# Altium footprint library Cty1.PcbLib: 869 footprints (part 15 of 55)
Each footprint in its own frame and in the unit in brackets; x right, y up, seen from the top. Pads: shape width x height; smd on the part's side, far side on the other; paste and mask are expansions set on the pad; w line width, h text height; cw(c..) or ccw(c..) is an arc to the next point about the centre after c.
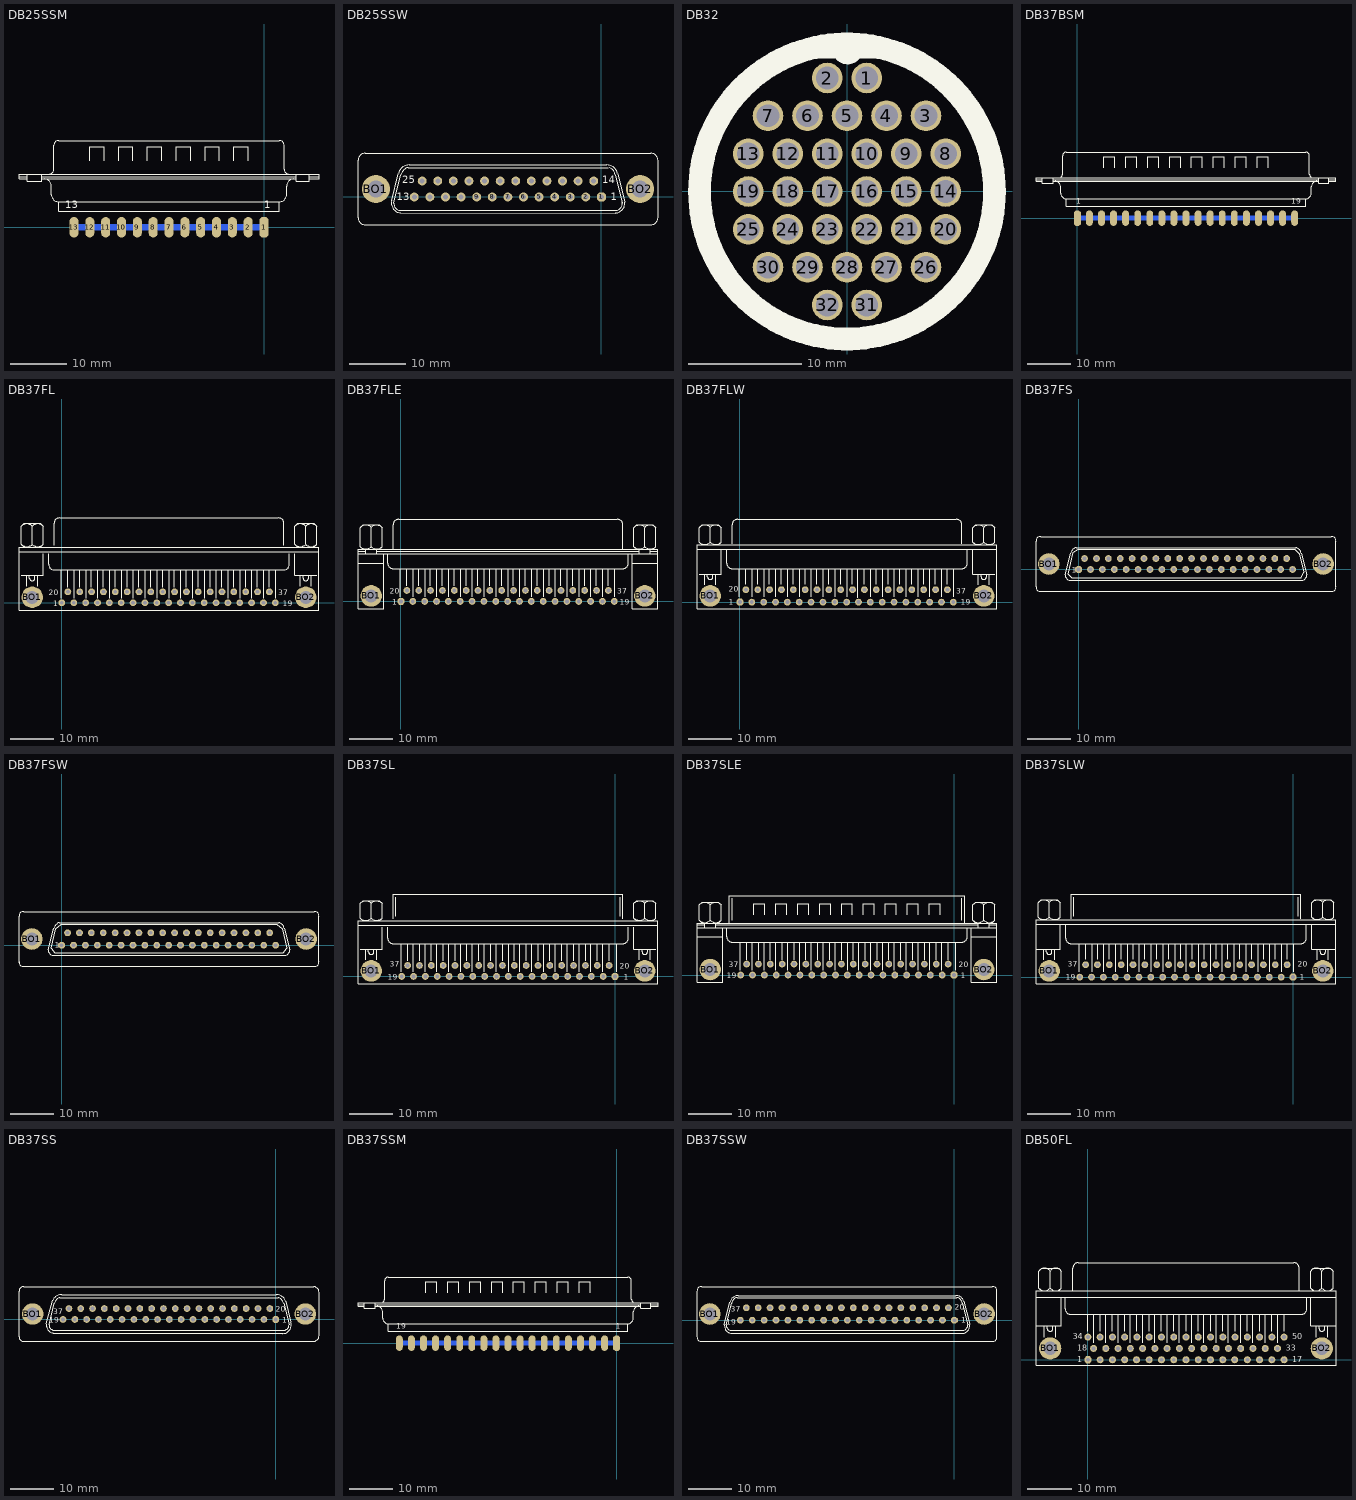
[diagram p14: the footprints below, top view; thin cyan lines are the x and y axes]

## DB25SSM [mil]
pads (25):
  oct 62.5x141.67 smd: 1(0,0)
  oval 62.5x141.67 smd: 2(-110,0) 3(-220,0) 4(-330,0) 5(-440,0) 6(-550,0) 7(-660,0) 8(-770,0) 9(-880,0) 10(-990,0) 11(-1100,0) 12(-1210,0) 13(-1320,0)
  oval 78.74x39.37 smd far side: 14(-55,0) 15(-165,0) 16(-275,0) 17(-385,0) 18(-495,0) 19(-605,0) 20(-715,0) 21(-825,0) 22(-935,0) 23(-1045,0) 24(-1155,0) 25(-1265,0)
Top Overlay:
  lines w8: -1701.67,351.67 -1643.33,351.67 ; -1643.33,335 -1701.67,335 -1701.67,368.33 381.67,368.33 381.67,335 315,335 ; -1643.33,368.33 -1643.33,318.33 -1543.33,318.33 -1543.33,368.33 ; -1543.33,335 223.33,335 ; -1543.33,351.67 223.33,351.67 ; -1526.67,335 cw(c-1526.67,285) -1476.67,285 -1476.67,226.67 ccw(c-1426.67,226.67) -1426.67,176.67 ; -1493.33,368.33 ccw(c-1493.33,401.67) -1460,401.67 -1460,568.33 cw(c-1426.67,568.33) -1426.67,601.67 106.67,601.67 cw(c106.67,568.33) 140,568.33 140,401.67 ccw(c173.33,401.67) 173.33,368.33 ; -1210,460 -1210,560 -1110,560 -1110,460 ; -1010,460 -1010,560 -910,560 -910,460 ; -810,460 -810,560 -710,560 -710,460 ; -610,460 -610,560 -510,560 -510,460 ; -410,460 -410,560 -310,560 -310,460 ; -210,460 -210,560 -110,560 -110,460 ; 206.67,335 ccw(c206.67,285) 156.67,285 156.67,226.67 cw(c106.67,226.67) 106.67,176.67 ; 223.33,368.33 223.33,318.33 315,318.33 315,368.33 ; 315,351.67 381.67,351.67 ; -1426.67,176.67 -1426.67,110 106.67,110 106.67,176.67 ; -1426.67,176.67 106.67,176.67
  text "13" at -1380,130 h50
  text "1" at 0,130 h50

## DB25SSW [mil]
pads (27):
  oct 62x62 hole 35: 1(0,0)
  round 62 hole 35: 2(-109.17,0) 3(-218.33,0) 4(-327.5,0) 5(-436.67,0) 6(-545.83,0) 7(-655,0) 8(-764.17,0) 9(-873.33,0) 10(-982.5,0) 11(-1091.67,0) 12(-1200.83,0) 13(-1310,0) 14(-54.17,111.67) 15(-163.33,111.67) 16(-272.5,111.67) 17(-381.67,111.67) 18(-490.83,111.67) 19(-600,111.67) 20(-709.17,111.67) 21(-818.33,111.67) 22(-927.5,111.67) 23(-1036.67,111.67) 24(-1145.83,111.67) 25(-1255,111.67)
  round 196.67 hole 118.33: BO1(-1579.17,55.83) BO2(270.83,55.83)
Top Overlay:
  lines w8: -1469.17,-25.83 -1420.83,164.17 ; -1468.25,-25.79 ccw(c-1404.17,-44.17) -1404.17,-110.83 95.83,-112.5 ; -1420.53,164.75 cw(c-1345.83,147.5) -1345.83,224.16 37.5,224.17 cw(c37.5,147.5) 112.2,164.75 ; -1404.17,155.83 -1454.17,-44.17 ccw(c-1404.17,-44.17) -1404.17,-94.17 95.83,-94.17 ccw(c95.83,-44.17) 145.22,-36.35 ; -1403.8,155.7 cw(c-1337.5,139.17) -1354.03,205.47 ; -1354.17,205.83 45.83,205.83 ; 53.81,204.37 cw(c37.5,147.5) 96.09,155.73 ; 95.83,-111.67 ccw(c95.83,-44.17) 162.83,-35.94 ; 95.83,155.83 145.83,-44.17 ; 112.5,164.17 162.5,-35.83 ; -1704.17,-144.17 ccw(c-1654.17,-144.17) -1654.17,-194.17 345.83,-194.17 ccw(c345.83,-144.17) 395.83,-144.17 395.83,255.83 ccw(c345.83,255.83) 345.83,305.83 -1654.17,305.83 ccw(c-1654.17,255.83) -1704.17,255.83 -1704.17,-144.17
  text "25" at -1394.17,95.83 h50
  text "14" at 5.83,95.83 h50
  text "1" at 65.83,-24.17 h50
  text "13" at -1434.17,-24.17 h50

## DB32 [mm] "CONNECTOR 32PIN RUSSIA"
height 10
pads (32):
  round 2.7 hole 2: 1(1.74,10) 2(-1.74,10) 3(6.96,6.667) 4(3.48,6.667) 5(0,6.667) 6(-3.48,6.667) 7(-6.96,6.667) 8(8.7,3.333) 9(5.22,3.333) 10(1.74,3.333) 11(-1.74,3.333) 12(-5.22,3.333) 13(-8.7,3.333) 14(8.7,0) 15(5.22,0) 16(1.74,0) 17(-1.74,0) 18(-5.22,0) 19(-8.7,0) 20(8.7,-3.333) 21(5.22,-3.333) 22(1.74,-3.333) 23(-1.74,-3.333) 24(-5.22,-3.333) 25(-8.7,-3.333) 26(6.96,-6.667) 27(3.48,-6.667) 28(0,-6.667) 29(-3.48,-6.667) 30(-6.96,-6.667) 31(1.74,-10) 32(-1.74,-10)
Top Overlay:
  circle w1: c0.051,12.573 r0.864
  circle w2: c0,0 r13
  rectangle: -2.565,11.709 2.946,12.802

## DB37BSM [mil]
pads (37):
  oct 62.5x141.67 smd: 1(0,0)
  oval 62.5x141.67 smd: 2(110,0) 3(220,0) 4(330,0) 5(440,0) 6(550,0) 7(660,0) 8(770,0) 9(880,0) 10(990,0) 11(1100,0) 12(1210,0) 13(1320,0) 14(1430,0) 15(1540,0) 16(1650,0) 17(1760,0) 18(1870,0) 19(1980,0)
  oval 78.74x39.37 smd far side: 20(55,0) 21(165,0) 22(275,0) 23(385,0) 24(495,0) 25(605,0) 26(715,0) 27(825,0) 28(935,0) 29(1045,0) 30(1155,0) 31(1265,0) 32(1375,0) 33(1485,0) 34(1595,0) 35(1705,0) 36(1815,0) 37(1925,0)
Top Overlay:
  lines w8: -376.67,351.67 -318.33,351.67 ; -318.33,335 -376.67,335 -376.67,368.33 2356.67,368.33 2356.67,335 2290,335 ; -318.33,368.33 -318.33,318.33 -218.33,318.33 -218.33,368.33 ; -218.33,335 2198.33,335 ; -218.33,351.67 2198.33,351.67 ; -201.67,335 cw(c-201.67,285) -151.67,285 -151.67,226.67 ccw(c-101.67,226.67) -101.67,176.67 ; -168.33,368.33 ccw(c-168.33,401.67) -135,401.67 -135,568.33 cw(c-101.67,568.33) -101.67,601.67 2081.67,601.67 cw(c2081.67,568.33) 2115,568.33 2115,401.67 ccw(c2148.33,401.67) 2148.33,368.33 ; 240,460 240,560 340,560 340,460 ; 440,460 440,560 540,560 540,460 ; 640,460 640,560 740,560 740,460 ; 840,460 840,560 940,560 940,460 ; 1040,460 1040,560 1140,560 1140,460 ; 1240,460 1240,560 1340,560 1340,460 ; 1440,460 1440,560 1540,560 1540,460 ; 1640,460 1640,560 1740,560 1740,460 ; 2181.67,335 ccw(c2181.67,285) 2131.67,285 2131.67,226.67 cw(c2081.67,226.67) 2081.67,176.67 ; 2198.33,368.33 2198.33,318.33 2290,318.33 2290,368.33 ; 2290,351.67 2356.67,351.67 ; -101.67,176.67 -101.67,110 2081.67,110 2081.67,176.67 ; -101.67,176.67 2081.67,176.67
  text "19" at 1950,130 h50
  text "1" at -10,130 h50

## DB37FL [mil]
pads (39):
  oct 62x62 hole 35: 1(0,0)
  round 62 hole 35: 2(110,0) 3(218.33,0) 4(326.67,0) 5(435,0) 6(543.33,0) 7(651.67,0) 8(760,0) 9(868.33,0) 10(976.67,0) 11(1085,0) 12(1193.33,0) 13(1301.67,0) 14(1410,0) 15(1518.33,0) 16(1626.67,0) 17(1735,0) 18(1843.33,0) 19(1951.67,0) 20(55.83,100) 21(164.17,100) 22(272.5,100) 23(380.83,100) 24(489.17,100) 25(597.5,100) 26(705.83,100) 27(814.17,100) 28(922.5,100) 29(1030.83,100) 30(1139.17,100) 31(1247.5,100) 32(1355.83,100) 33(1464.17,100) 34(1572.5,100) 35(1680.83,100) 36(1789.17,100) 37(1897.5,100)
  round 196.67 hole 118.33: BO1(-270,50) BO2(2230,50)
Top Overlay:
  lines w8: -386.67,466.67 2346.67,466.67 ; -370.09,533.25 ccw(c-320,583.33) -269.91,533.25 ; -370.09,700.09 cw(c-320,650) -269.91,700.09 ; -370,250 -170,250 -170,450 ; -345,508.33 -370,533.33 -370,700 -345,725 -195,725 -170,700 -170,533.33 -195,508.33 ; -320,150 -320,250 ; -295,250 -295,225 ccw(c-270,225) -245,225 -245,250 ; -270.09,533.25 ccw(c-220,583.33) -169.91,533.25 ; -270.09,700.09 cw(c-220,650) -169.91,700.09 ; -270,533.33 -270,675 -270,700 ; -220,150 -220,250 ; -120,450 -120,350 ccw(c-70,350) -70,300 2030,300 ccw(c2030,350) 2080,350 2080,450 ; -70,525 -70,725 cw(c-20,725) -20,775 1980,775 cw(c1980,725) 2030,725 2030,525 ; -3.33,41.67 -3.33,300 ; 55,141.67 55,300 ; 113.33,41.67 113.33,291.67 113.33,300 ; 163.33,141.67 163.33,300 ; 221.67,41.67 221.67,291.67 221.67,300 ; 271.67,141.67 271.67,300 ; 330,41.67 330,291.67 330,300 ; 380,141.67 380,300 ; 438.33,41.67 438.33,291.67 438.33,300 ; 488.33,141.67 488.33,300 ; 546.67,41.67 546.67,291.67 546.67,300 ; 596.67,141.67 596.67,300 ; 655,41.67 655,291.67 655,300 ; 705,141.67 705,300 ; 763.33,41.67 763.33,291.67 763.33,300 ; 813.33,141.67 813.33,300 ; 871.67,41.67 871.67,291.67 871.67,300 ; 921.67,141.67 921.67,300 ; 980,41.67 980,300 ; 1030,141.67 1030,300 ; 1088.33,41.67 1088.33,300 ; 1138.33,141.67 1138.33,300 ; 1196.67,41.67 1196.67,291.67 1196.67,300 ; 1246.67,141.67 1246.67,300 ; 1305,41.67 1305,291.67 1305,300 ; 1355,141.67 1355,300 ; 1413.33,41.67 1413.33,291.67 1413.33,300 ; 1463.33,141.67 1463.33,300 ; 1521.67,41.67 1521.67,291.67 1521.67,300 ; 1571.67,141.67 1571.67,300 ; 1630,41.67 1630,291.67 1630,300 ; 1680,141.67 1680,300 ; 1738.33,41.67 1738.33,291.67 1738.33,300 ; 1788.33,141.67 1788.33,300 ; 1846.67,41.67 1846.67,291.67 1846.67,300 ; 1896.67,141.67 1896.67,300 ; 1955,41.67 1955,291.67 1955,300 ; 2129.91,533.25 ccw(c2180,583.33) 2230.09,533.25 ; 2129.91,700.09 cw(c2180,650) 2230.09,700.09 ; 2130,450 2130,250 2330,250 ; 2155,508.33 2130,533.33 2130,700 2155,725 2305,725 2330,700 2330,533.33 2305,508.33 ; 2180,150 2180,250 ; 2205,250 2205,225 ccw(c2230,225) 2255,225 2255,250 ; 2229.91,533.25 ccw(c2280,583.33) 2330.09,533.25 ; 2229.91,700.09 cw(c2280,650) 2330.09,700.09 ; 2230,533.33 2230,675 2230,700 ; 2280,150 2280,250 ; -386.67,-66.67 2346.67,-66.67 2346.67,508.33 -386.67,508.33 -386.67,-66.67
  text "19" at 2020,-30 h50
  text "37" at 1980,70 h50
  text "20" at -120,70 h50
  text "1" at -80,-30 h50

## DB37FLE [mil]
pads (39):
  oct 62x62 hole 35: 1(0,0)
  round 62 hole 35: 2(108.33,0) 3(216.67,0) 4(325,0) 5(433.33,0) 6(541.67,0) 7(650,0) 8(758.33,0) 9(866.67,0) 10(975,0) 11(1083.33,0) 12(1191.67,0) 13(1300,0) 14(1408.33,0) 15(1516.67,0) 16(1625,0) 17(1733.33,0) 18(1841.67,0) 19(1950,0) 20(54.17,100) 21(162.5,100) 22(270.83,100) 23(379.17,100) 24(487.5,100) 25(595.83,100) 26(704.17,100) 27(812.5,100) 28(920.83,100) 29(1029.17,100) 30(1137.5,100) 31(1245.83,100) 32(1354.17,100) 33(1462.5,100) 34(1570.83,100) 35(1679.17,100) 36(1787.5,100) 37(1895.83,100)
  round 196.67 hole 118.33: BO1(-271.67,50) BO2(2228.33,50)
Top Overlay:
  lines w8: -388.33,350 -155,350 ; -388.33,433.33 2345,433.33 ; -388.33,458.33 -321.67,458.33 ; -371.75,499.91 ccw(c-321.67,550) -271.58,499.91 ; -371.75,675.09 cw(c-321.67,625) -271.58,675.09 ; -346.67,475 -371.67,500 -371.67,675 -346.67,700 -196.67,700 -171.67,675 -171.67,500 -196.67,475 ; -321.67,433.33 -321.67,475 ; -271.75,499.91 ccw(c-221.67,550) -171.58,499.91 ; -271.75,675.09 cw(c-221.67,625) -171.58,675.09 ; -271.67,500 -271.67,675 ; -221.67,433.33 -221.67,475 ; -221.67,458.33 2178.33,458.33 ; -155,433.33 -155,-66.67 -388.33,-66.67 -388.33,475 2345,475 2345,-66.67 2111.67,-66.67 2111.67,433.33 ; -121.67,433.33 -121.67,350 ccw(c-71.67,350) -71.67,300 2028.33,300 ccw(c2028.33,350) 2078.33,350 2078.33,433.33 ; -71.67,475 -71.67,700 cw(c-21.67,700) -21.67,750 1978.33,750 cw(c1978.33,700) 2028.33,700 2028.33,475 ; -5,41.67 -5,300 ; 53.33,141.67 53.33,300 ; 111.67,41.67 111.67,291.67 111.67,300 ; 161.67,141.67 161.67,300 ; 220,41.67 220,291.67 220,300 ; 270,141.67 270,300 ; 328.33,41.67 328.33,291.67 328.33,300 ; 378.33,141.67 378.33,300 ; 436.67,41.67 436.67,291.67 436.67,300 ; 486.67,141.67 486.67,300 ; 545,41.67 545,291.67 545,300 ; 595,141.67 595,300 ; 653.33,41.67 653.33,291.67 653.33,300 ; 703.33,141.67 703.33,300 ; 761.67,41.67 761.67,291.67 761.67,300 ; 811.67,141.67 811.67,300 ; 870,41.67 870,291.67 870,300 ; 920,141.67 920,300 ; 978.33,41.67 978.33,300 ; 1028.33,141.67 1028.33,300 ; 1086.67,41.67 1086.67,300 ; 1136.67,141.67 1136.67,300 ; 1195,41.67 1195,291.67 1195,300 ; 1245,141.67 1245,300 ; 1303.33,41.67 1303.33,291.67 1303.33,300 ; 1353.33,141.67 1353.33,300 ; 1411.67,41.67 1411.67,291.67 1411.67,300 ; 1461.67,141.67 1461.67,300 ; 1520,41.67 1520,291.67 1520,300 ; 1570,141.67 1570,300 ; 1628.33,41.67 1628.33,291.67 1628.33,300 ; 1678.33,141.67 1678.33,300 ; 1736.67,41.67 1736.67,291.67 1736.67,300 ; 1786.67,141.67 1786.67,300 ; 1845,41.67 1845,291.67 1845,300 ; 1895,141.67 1895,300 ; 1953.33,41.67 1953.33,291.67 1953.33,300 ; 2111.67,350 2345,350 ; 2128.25,499.91 ccw(c2178.33,550) 2228.42,499.91 ; 2128.25,675.09 cw(c2178.33,625) 2228.42,675.09 ; 2153.33,475 2128.33,500 2128.33,675 2153.33,700 2303.33,700 2328.33,675 2328.33,500 2303.33,475 ; 2178.33,433.33 2178.33,475 ; 2228.25,499.91 ccw(c2278.33,550) 2328.42,499.91 ; 2228.25,675.09 cw(c2278.33,625) 2328.42,675.09 ; 2228.33,500 2228.33,675 ; 2278.33,433.33 2278.33,475 ; 2278.33,458.33 2345,458.33
  text "1" at -81.67,-30 h50
  text "37" at 1978.33,70 h50
  text "19" at 1998.33,-30 h50
  text "20" at -101.67,70 h50

## DB37FLW [mil]
pads (39):
  oct 62x62 hole 35: 1(0,0)
  round 62 hole 35: 2(108.33,0) 3(216.67,0) 4(325,0) 5(433.33,0) 6(541.67,0) 7(650,0) 8(758.33,0) 9(866.67,0) 10(975,0) 11(1083.33,0) 12(1191.67,0) 13(1300,0) 14(1408.33,0) 15(1516.67,0) 16(1625,0) 17(1733.33,0) 18(1841.67,0) 19(1950,0) 20(54.17,113.33) 21(162.5,113.33) 22(270.83,113.33) 23(379.17,113.33) 24(487.5,113.33) 25(595.83,113.33) 26(704.17,113.33) 27(812.5,113.33) 28(920.83,113.33) 29(1029.17,113.33) 30(1137.5,113.33) 31(1245.83,113.33) 32(1354.17,113.33) 33(1462.5,113.33) 34(1570.83,113.33) 35(1679.17,113.33) 36(1787.5,113.33) 37(1895.83,113.33)
  round 196.67 hole 118.33: BO1(-271.67,56.67) BO2(2228.33,56.67)
Top Overlay:
  lines w8: -388.33,481.67 2345,481.67 ; -371.75,548.25 ccw(c-321.67,598.33) -271.58,548.25 ; -371.75,681.75 cw(c-321.67,631.67) -271.58,681.75 ; -371.67,256.67 -171.67,256.67 -171.67,331.67 -171.67,481.67 ; -346.67,523.33 -371.67,548.33 -371.67,556.67 -371.67,681.67 -346.67,706.67 -196.67,706.67 -171.67,681.67 -171.67,673.33 -171.67,548.33 -196.67,523.33 ; -321.67,156.67 -321.67,256.67 ; -296.67,256.67 -296.67,231.67 ccw(c-271.67,231.67) -246.67,231.67 -246.67,256.67 ; -271.75,548.25 ccw(c-221.67,598.33) -171.58,548.25 ; -271.75,681.75 cw(c-221.67,631.67) -171.58,681.75 ; -271.67,548.33 -271.67,681.67 ; -221.67,156.67 -221.67,256.67 ; -121.67,481.67 -121.67,356.67 ccw(c-71.67,356.67) -71.67,306.67 2028.33,306.67 ccw(c2028.33,356.67) 2078.33,356.67 2078.33,481.67 ; -71.67,531.67 -71.67,706.67 cw(c-21.67,706.67) -21.67,756.67 1978.33,756.67 cw(c1978.33,706.67) 2028.33,706.67 2028.33,531.67 ; -5,48.33 -5,306.67 ; 53.33,165 53.33,306.67 ; 111.67,48.33 111.67,306.67 ; 161.67,165 161.67,306.67 ; 220,48.33 220,306.67 ; 270,165 270,306.67 ; 328.33,48.33 328.33,306.67 ; 378.33,165 378.33,306.67 ; 436.67,48.33 436.67,306.67 ; 486.67,165 486.67,306.67 ; 545,48.33 545,306.67 ; 595,165 595,306.67 ; 653.33,48.33 653.33,306.67 ; 703.33,165 703.33,306.67 ; 761.67,48.33 761.67,306.67 ; 811.67,165 811.67,306.67 ; 870,48.33 870,306.67 ; 920,165 920,306.67 ; 978.33,48.33 978.33,306.67 ; 1028.33,165 1028.33,306.67 ; 1078.33,40 1078.33,306.67 ; 1136.67,165 1136.67,306.67 ; 1195,48.33 1195,306.67 ; 1245,165 1245,306.67 ; 1303.33,48.33 1303.33,306.67 ; 1353.33,165 1353.33,306.67 ; 1411.67,48.33 1411.67,306.67 ; 1461.67,165 1461.67,306.67 ; 1520,48.33 1520,306.67 ; 1570,165 1570,306.67 ; 1628.33,48.33 1628.33,306.67 ; 1678.33,165 1678.33,306.67 ; 1736.67,48.33 1736.67,306.67 ; 1786.67,165 1786.67,306.67 ; 1845,48.33 1845,306.67 ; 1895,165 1895,306.67 ; 1953.33,48.33 1953.33,306.67 ; 2128.25,548.25 ccw(c2178.33,598.33) 2228.42,548.25 ; 2128.25,681.75 cw(c2178.33,631.67) 2228.42,681.75 ; 2128.33,481.67 2128.33,256.67 2328.33,256.67 ; 2153.33,523.33 2128.33,548.33 2128.33,556.67 2128.33,681.67 2153.33,706.67 2303.33,706.67 2328.33,681.67 2328.33,673.33 2328.33,548.33 2303.33,523.33 ; 2178.33,156.67 2178.33,256.67 ; 2203.33,256.67 2203.33,231.67 ccw(c2228.33,231.67) 2253.33,231.67 2253.33,256.67 ; 2228.25,548.25 ccw(c2278.33,598.33) 2328.42,548.25 ; 2228.25,681.75 cw(c2278.33,631.67) 2328.42,681.75 ; 2228.33,548.33 2228.33,681.67 ; 2278.33,156.67 2278.33,256.67 ; -388.33,-60 2345,-60 2345,523.33 -388.33,523.33 -388.33,-60
  text "37" at 1978.33,76.67 h50
  text "1" at -101.67,-23.33 h50
  text "20" at -101.67,96.67 h50
  text "19" at 2018.33,-23.33 h50

## DB37FS [mil]
pads (39):
  oct 62x62 hole 35: 1(0,0)
  round 62 hole 35: 2(108.33,0) 3(216.67,0) 4(325,0) 5(433.33,0) 6(541.67,0) 7(650,0) 8(758.33,0) 9(866.67,0) 10(975,0) 11(1083.33,0) 12(1191.67,0) 13(1300,0) 14(1408.33,0) 15(1516.67,0) 16(1625,0) 17(1733.33,0) 18(1841.67,0) 19(1950,0) 20(54.17,100) 21(162.5,100) 22(270.83,100) 23(379.17,100) 24(487.5,100) 25(595.83,100) 26(704.17,100) 27(812.5,100) 28(920.83,100) 29(1029.17,100) 30(1137.5,100) 31(1245.83,100) 32(1354.17,100) 33(1462.5,100) 34(1570.83,100) 35(1679.17,100) 36(1787.5,100) 37(1895.83,100)
  round 196.67 hole 118.33: BO1(-271.67,50) BO2(2228.33,50)
Top Overlay:
  lines w8: -71.67,150 -121.67,-50 ccw(c-71.67,-50) -71.67,-100 2028.33,-100 ccw(c2028.33,-50) 2078.33,-50 2028.33,150 ; -70.69,152.17 cw(c-5,133.33) -21.53,199.64 ; -21.67,200 1978.33,200 ; 1978.2,199.64 cw(c1961.67,133.33) 2027.97,149.86 ; -388.33,-158.33 ccw(c-346.67,-158.33) -346.67,-200 2303.33,-200 ccw(c2303.33,-158.33) 2345,-158.33 2345,258.33 ccw(c2303.33,258.33) 2303.33,300 -346.67,300 ccw(c-346.67,258.33) -388.33,258.33 -388.33,-158.33 ; -96.67,-41.67 -46.67,158.33 -5,183.33 1970,183.33 2011.67,141.67 2053.33,-25 2028.33,-75 -63.33,-75 -96.67,-41.67
  text "1" at -61.67,-30 h50

## DB37FSW [mil]
pads (39):
  oct 62x62 hole 35: 1(0,0)
  round 62 hole 35: 2(108.33,0) 3(216.67,0) 4(325,0) 5(433.33,0) 6(541.67,0) 7(650,0) 8(758.33,0) 9(866.67,0) 10(975,0) 11(1083.33,0) 12(1191.67,0) 13(1300,0) 14(1408.33,0) 15(1516.67,0) 16(1625,0) 17(1733.33,0) 18(1841.67,0) 19(1950,0) 20(54.17,113.33) 21(162.5,113.33) 22(270.83,113.33) 23(379.17,113.33) 24(487.5,113.33) 25(595.83,113.33) 26(704.17,113.33) 27(812.5,113.33) 28(920.83,113.33) 29(1029.17,113.33) 30(1137.5,113.33) 31(1245.83,113.33) 32(1354.17,113.33) 33(1462.5,113.33) 34(1570.83,113.33) 35(1679.17,113.33) 36(1787.5,113.33) 37(1895.83,113.33)
  round 196.67 hole 118.33: BO1(-271.67,56.67) BO2(2228.33,56.67)
Top Overlay:
  lines w8: -388.33,-160 -388.33,265 cw(c-346.67,265) -346.67,306.67 2303.33,306.67 cw(c2303.33,265) 2345,265 2345,-160 ; -388.33,-151.67 ccw(c-346.67,-151.67) -346.67,-193.33 2303.33,-193.33 ccw(c2303.33,-151.67) 2345,-151.67 ; -75.27,146.63 cw(c11.67,123.33) -22.05,206.78 ; -71.67,156.67 -121.67,-43.33 ccw(c-71.67,-43.33) -71.67,-93.33 2028.33,-93.33 ccw(c2028.33,-43.33) 2078.33,-43.33 2028.33,156.67 ; -21.67,206.67 1978.33,206.67 ; 1978.2,206.3 cw(c1961.67,140) 2027.97,156.53 ; -96.67,-26.67 -63.33,-68.33 2020,-68.33 2053.33,-26.67 2011.67,148.33 1961.67,190 -5,190 -55,148.33 -96.67,-26.67
  text "1" at -61.67,-23.33 h50

## DB37SL [mil]
pads (39):
  oct 62x62 hole 35: 1(0,0)
  round 62 hole 35: 2(-108.33,0) 3(-216.67,0) 4(-325,0) 5(-433.33,0) 6(-541.67,0) 7(-650,0) 8(-758.33,0) 9(-866.67,0) 10(-975,0) 11(-1083.33,0) 12(-1191.67,0) 13(-1300,0) 14(-1408.33,0) 15(-1516.67,0) 16(-1625,0) 17(-1733.33,0) 18(-1841.67,0) 19(-1950,0) 20(-54.17,100) 21(-162.5,100) 22(-270.83,100) 23(-379.17,100) 24(-487.5,100) 25(-595.83,100) 26(-704.17,100) 27(-812.5,100) 28(-920.83,100) 29(-1029.17,100) 30(-1137.5,100) 31(-1245.83,100) 32(-1354.17,100) 33(-1462.5,100) 34(-1570.83,100) 35(-1679.17,100) 36(-1787.5,100) 37(-1895.83,100)
  round 196.67 hole 118.33: BO1(-2228.33,50) BO2(271.67,50)
Top Overlay:
  lines w8: -2345,466.67 388.33,466.67 ; -2328.42,533.25 ccw(c-2278.33,583.33) -2228.25,533.25 ; -2328.42,666.75 cw(c-2278.33,616.67) -2228.25,666.75 ; -2328.33,250 -2128.33,250 -2128.33,450 ; -2303.33,508.33 -2328.33,533.33 -2328.33,541.67 -2328.33,666.67 -2303.33,691.67 -2153.33,691.67 -2128.33,666.67 -2128.33,658.33 -2128.33,533.33 -2153.33,508.33 ; -2278.33,150 -2278.33,250 ; -2253.33,250 -2253.33,225 ccw(c-2228.33,225) -2203.33,225 -2203.33,250 ; -2228.42,533.25 ccw(c-2178.33,583.33) -2128.25,533.25 ; -2228.42,666.75 cw(c-2178.33,616.67) -2128.25,666.75 ; -2228.33,533.33 -2228.33,666.67 ; -2178.33,150 -2178.33,250 ; -2078.33,450 -2078.33,350 ccw(c-2028.33,350) -2028.33,300 71.67,300 ccw(c71.67,350) 121.67,350 121.67,450 ; -2028.33,525 -2028.33,750 71.67,750 71.67,525 ; -2003.33,550 -2003.33,725 ; -1953.33,41.67 -1953.33,300 ; -1895,141.67 -1895,300 ; -1845,41.67 -1845,300 ; -1786.67,141.67 -1786.67,300 ; -1736.67,41.67 -1736.67,300 ; -1678.33,141.67 -1678.33,300 ; -1628.33,41.67 -1628.33,300 ; -1570,141.67 -1570,300 ; -1520,41.67 -1520,300 ; -1461.67,141.67 -1461.67,300 ; -1411.67,41.67 -1411.67,300 ; -1353.33,141.67 -1353.33,300 ; -1303.33,41.67 -1303.33,300 ; -1245,141.67 -1245,300 ; -1195,41.67 -1195,300 ; -1136.67,141.67 -1136.67,300 ; -1086.67,41.67 -1086.67,300 ; -1028.33,141.67 -1028.33,300 ; -970,41.67 -970,300 ; -920,141.67 -920,300 ; -870,41.67 -870,300 ; -811.67,141.67 -811.67,300 ; -761.67,41.67 -761.67,300 ; -703.33,141.67 -703.33,300 ; -653.33,41.67 -653.33,300 ; -595,141.67 -595,300 ; -545,41.67 -545,300 ; -486.67,141.67 -486.67,300 ; -436.67,41.67 -436.67,300 ; -378.33,141.67 -378.33,300 ; -328.33,41.67 -328.33,300 ; -270,141.67 -270,300 ; -220,41.67 -220,300 ; -161.67,141.67 -161.67,300 ; -111.67,41.67 -111.67,300 ; -53.33,141.67 -53.33,300 ; 13.33,41.67 13.33,300 ; 46.67,550 46.67,725 ; 171.58,533.25 ccw(c221.67,583.33) 271.75,533.25 ; 171.58,666.75 cw(c221.67,616.67) 271.75,666.75 ; 171.67,450 171.67,250 371.67,250 ; 196.67,508.33 171.67,533.33 171.67,541.67 171.67,666.67 196.67,691.67 346.67,691.67 371.67,666.67 371.67,533.33 346.67,508.33 ; 221.67,150 221.67,250 ; 246.67,250 246.67,225 ccw(c271.67,225) 296.67,225 296.67,250 ; 271.58,533.25 ccw(c321.67,583.33) 371.75,533.25 ; 271.58,666.75 cw(c321.67,616.67) 371.75,666.75 ; 271.67,533.33 271.67,666.67 ; 321.67,150 321.67,250 ; -2345,-66.67 388.33,-66.67 388.33,508.33 -2345,508.33 -2345,-66.67
  text "20" at 41.67,70 h50
  text "1" at 81.67,-30 h50
  text "19" at -2078.33,-30 h50
  text "37" at -2058.33,90 h50

## DB37SLE [mil]
pads (39):
  oct 62x62 hole 35: 1(0,0)
  round 62 hole 35: 2(-108.33,0) 3(-216.67,0) 4(-325,0) 5(-433.33,0) 6(-541.67,0) 7(-650,0) 8(-758.33,0) 9(-866.67,0) 10(-975,0) 11(-1083.33,0) 12(-1191.67,0) 13(-1300,0) 14(-1408.33,0) 15(-1516.67,0) 16(-1625,0) 17(-1733.33,0) 18(-1841.67,0) 19(-1950,0) 20(-54.17,100) 21(-162.5,100) 22(-270.83,100) 23(-379.17,100) 24(-487.5,100) 25(-595.83,100) 26(-704.17,100) 27(-812.5,100) 28(-920.83,100) 29(-1029.17,100) 30(-1137.5,100) 31(-1245.83,100) 32(-1354.17,100) 33(-1462.5,100) 34(-1570.83,100) 35(-1679.17,100) 36(-1787.5,100) 37(-1895.83,100)
  round 196.67 hole 118.33: BO1(-2228.33,50) BO2(271.67,50)
Top Overlay:
  lines w8: -2345,350 -2111.67,350 ; -2345,433.33 388.33,433.33 ; -2345,458.33 -2278.33,458.33 ; -2328.42,499.91 ccw(c-2278.33,550) -2228.25,499.91 ; -2328.42,641.75 cw(c-2278.33,591.67) -2228.25,641.75 ; -2303.33,475 -2328.33,500 -2328.33,641.67 -2303.33,666.67 -2153.33,666.67 -2128.33,641.67 -2128.33,500 -2153.33,475 ; -2278.33,433.33 -2278.33,475 ; -2228.42,499.91 ccw(c-2178.33,550) -2128.25,499.91 ; -2228.42,641.75 cw(c-2178.33,591.67) -2128.25,641.75 ; -2228.33,500 -2228.33,641.67 ; -2178.33,433.33 -2178.33,475 ; -2178.33,458.33 221.67,458.33 ; -2111.67,433.33 -2111.67,-66.67 -2345,-66.67 -2345,475 388.33,475 388.33,-66.67 155,-66.67 155,433.33 ; -2078.33,433.33 -2078.33,350 ccw(c-2028.33,350) -2028.33,300 71.67,300 ccw(c71.67,350) 121.67,350 121.67,433.33 ; -2053.33,475 -2053.33,725 96.67,725 96.67,475 ; -2028.33,500 -2028.33,700 ; -1953.33,41.67 -1953.33,300 ; -1895,141.67 -1895,300 ; -1845,41.67 -1845,300 ; -1828.33,550 -1828.33,650 -1728.33,650 -1728.33,550 ; -1786.67,141.67 -1786.67,300 ; -1736.67,41.67 -1736.67,300 ; -1678.33,141.67 -1678.33,300 ; -1628.33,41.67 -1628.33,300 ; -1628.33,550 -1628.33,650 -1528.33,650 -1528.33,550 ; -1570,141.67 -1570,300 ; -1520,41.67 -1520,300 ; -1461.67,141.67 -1461.67,300 ; -1428.33,550 -1428.33,650 -1328.33,650 -1328.33,550 ; -1411.67,41.67 -1411.67,300 ; -1353.33,141.67 -1353.33,300 ; -1303.33,41.67 -1303.33,300 ; -1245,141.67 -1245,300 ; -1228.33,550 -1228.33,650 -1128.33,650 -1128.33,550 ; -1195,41.67 -1195,300 ; -1136.67,141.67 -1136.67,300 ; -1086.67,41.67 -1086.67,300 ; -1028.33,141.67 -1028.33,300 ; -1028.33,550 -1028.33,650 -928.33,650 -928.33,550 ; -970,41.67 -970,300 ; -920,141.67 -920,300 ; -870,41.67 -870,300 ; -828.33,550 -828.33,650 -728.33,650 -728.33,550 ; -811.67,141.67 -811.67,300 ; -761.67,41.67 -761.67,300 ; -703.33,141.67 -703.33,300 ; -653.33,41.67 -653.33,300 ; -628.33,550 -628.33,650 -528.33,650 -528.33,550 ; -595,141.67 -595,300 ; -545,41.67 -545,300 ; -486.67,141.67 -486.67,300 ; -436.67,41.67 -436.67,300 ; -428.33,550 -428.33,650 -328.33,650 -328.33,550 ; -378.33,141.67 -378.33,300 ; -328.33,41.67 -328.33,300 ; -270,141.67 -270,300 ; -228.33,550 -228.33,650 -128.33,650 -128.33,550 ; -220,41.67 -220,300 ; -161.67,141.67 -161.67,300 ; -111.67,41.67 -111.67,300 ; -53.33,141.67 -53.33,300 ; 13.33,41.67 13.33,300 ; 71.67,500 71.67,700 ; 155,350 388.33,350 ; 171.58,499.91 ccw(c221.67,550) 271.75,499.91 ; 171.58,641.75 cw(c221.67,591.67) 271.75,641.75 ; 196.67,475 171.67,500 171.67,641.67 196.67,666.67 346.67,666.67 371.67,641.67 371.67,633.33 371.67,500 346.67,475 ; 221.67,433.33 221.67,475 ; 271.58,499.91 ccw(c321.67,550) 371.75,499.91 ; 271.58,641.75 cw(c321.67,591.67) 371.75,641.75 ; 271.67,500 271.67,641.67 ; 321.67,433.33 321.67,475 ; 321.67,458.33 388.33,458.33
  text "1" at 61.67,-30 h50
  text "20" at 41.67,70 h50
  text "37" at -2058.33,70 h50
  text "19" at -2078.33,-30 h50

## DB37SLW [mil]
pads (39):
  oct 62x62 hole 35: 1(0,0)
  round 62 hole 35: 2(-108.33,0) 3(-216.67,0) 4(-325,0) 5(-433.33,0) 6(-541.67,0) 7(-650,0) 8(-758.33,0) 9(-866.67,0) 10(-975,0) 11(-1083.33,0) 12(-1191.67,0) 13(-1300,0) 14(-1408.33,0) 15(-1516.67,0) 16(-1625,0) 17(-1733.33,0) 18(-1841.67,0) 19(-1950,0) 20(-54.17,113.33) 21(-162.5,113.33) 22(-270.83,113.33) 23(-379.17,113.33) 24(-487.5,113.33) 25(-595.83,113.33) 26(-704.17,113.33) 27(-812.5,113.33) 28(-920.83,113.33) 29(-1029.17,113.33) 30(-1137.5,113.33) 31(-1245.83,113.33) 32(-1354.17,113.33) 33(-1462.5,113.33) 34(-1570.83,113.33) 35(-1679.17,113.33) 36(-1787.5,113.33) 37(-1895.83,113.33)
  round 196.67 hole 118.33: BO1(-2228.33,56.67) BO2(271.67,56.67)
Top Overlay:
  lines w8: -2345,256.67 -2128.33,256.67 -2128.33,481.67 ; -2345,481.67 388.33,481.67 ; -2328.42,548.25 ccw(c-2278.33,598.33) -2228.25,548.25 ; -2328.42,681.75 cw(c-2278.33,631.67) -2228.25,681.75 ; -2303.33,523.33 -2328.33,548.33 -2328.33,556.67 -2328.33,681.67 -2303.33,706.67 -2153.33,706.67 -2128.33,681.67 -2128.33,548.33 -2153.33,523.33 ; -2278.33,156.67 -2278.33,256.67 ; -2253.33,256.67 -2253.33,231.67 ccw(c-2228.33,231.67) -2203.33,231.67 -2203.33,256.67 ; -2228.42,548.25 ccw(c-2178.33,598.33) -2128.25,548.25 ; -2228.42,681.75 cw(c-2178.33,631.67) -2128.25,681.75 ; -2228.33,548.33 -2228.33,681.67 ; -2178.33,156.67 -2178.33,256.67 ; -2078.33,481.67 -2078.33,356.67 ccw(c-2028.33,356.67) -2028.33,306.67 71.67,306.67 ccw(c71.67,356.67) 121.67,356.67 121.67,481.67 ; -2028.33,531.67 -2028.33,756.67 71.67,756.67 71.67,531.67 ; -2003.33,556.67 -2003.33,731.67 ; -1953.33,48.33 -1953.33,306.67 ; -1895,165 -1895,306.67 ; -1836.67,48.33 -1836.67,306.67 ; -1786.67,165 -1786.67,306.67 ; -1728.33,48.33 -1728.33,306.67 ; -1678.33,165 -1678.33,306.67 ; -1620,48.33 -1620,306.67 ; -1570,165 -1570,306.67 ; -1511.67,48.33 -1511.67,306.67 ; -1461.67,165 -1461.67,306.67 ; -1403.33,48.33 -1403.33,306.67 ; -1353.33,165 -1353.33,306.67 ; -1295,48.33 -1295,306.67 ; -1245,165 -1245,306.67 ; -1186.67,48.33 -1186.67,306.67 ; -1136.67,165 -1136.67,306.67 ; -1078.33,48.33 -1078.33,306.67 ; -1028.33,165 -1028.33,306.67 ; -978.33,48.33 -978.33,306.67 ; -920,165 -920,306.67 ; -861.67,48.33 -861.67,306.67 ; -811.67,165 -811.67,306.67 ; -753.33,48.33 -753.33,306.67 ; -703.33,165 -703.33,306.67 ; -645,48.33 -645,306.67 ; -595,165 -595,306.67 ; -536.67,48.33 -536.67,306.67 ; -486.67,165 -486.67,306.67 ; -428.33,48.33 -428.33,306.67 ; -378.33,165 -378.33,306.67 ; -320,48.33 -320,306.67 ; -270,165 -270,306.67 ; -211.67,48.33 -211.67,306.67 ; -161.67,165 -161.67,306.67 ; -103.33,48.33 -103.33,306.67 ; -53.33,165 -53.33,306.67 ; 5,48.33 5,306.67 ; 46.67,556.67 46.67,731.67 ; 171.58,548.25 ccw(c221.67,598.33) 271.75,548.25 ; 171.58,681.75 cw(c221.67,631.67) 271.75,681.75 ; 171.67,481.67 171.67,256.67 388.33,256.67 ; 196.67,523.33 171.67,548.33 171.67,556.67 171.67,681.67 196.67,706.67 346.67,706.67 371.67,681.67 371.67,548.33 346.67,523.33 ; 221.67,156.67 221.67,256.67 ; 246.67,256.67 246.67,231.67 ccw(c271.67,231.67) 296.67,231.67 296.67,256.67 ; 271.58,548.25 ccw(c321.67,598.33) 371.75,548.25 ; 271.58,681.75 cw(c321.67,631.67) 371.75,681.75 ; 271.67,548.33 271.67,681.67 ; 321.67,156.67 321.67,256.67 ; -2345,-60 -2345,523.33 388.33,523.33 388.33,-60 -2345,-60
  text "37" at -2058.33,96.67 h50
  text "19" at -2078.33,-23.33 h50
  text "1" at 61.67,-23.33 h50
  text "20" at 41.67,96.67 h50

## DB37SS [mil]
pads (39):
  oct 62x62 hole 35: 1(0,0)
  round 62 hole 35: 2(-108.33,0) 3(-216.67,0) 4(-325,0) 5(-433.33,0) 6(-541.67,0) 7(-650,0) 8(-758.33,0) 9(-866.67,0) 10(-975,0) 11(-1083.33,0) 12(-1191.67,0) 13(-1300,0) 14(-1408.33,0) 15(-1516.67,0) 16(-1625,0) 17(-1733.33,0) 18(-1841.67,0) 19(-1950,0) 20(-54.17,100) 21(-162.5,100) 22(-270.83,100) 23(-379.17,100) 24(-487.5,100) 25(-595.83,100) 26(-704.17,100) 27(-812.5,100) 28(-920.83,100) 29(-1029.17,100) 30(-1137.5,100) 31(-1245.83,100) 32(-1354.17,100) 33(-1462.5,100) 34(-1570.83,100) 35(-1679.17,100) 36(-1787.5,100) 37(-1895.83,100)
  round 196.67 hole 118.33: BO1(-2228.33,50) BO2(271.67,50)
Top Overlay:
  lines w8: -2103.33,-41.67 -2045,175 ; -2102.92,-42.16 ccw(c-2028.33,-50) -2028.33,-125 63.33,-125 ; -2044.83,175.71 cw(c-1961.67,133.33) -1961.67,226.67 5,226.67 cw(c5,133.33) 91.54,168.3 ; -2028.33,150 -2078.33,-50 ccw(c-2028.33,-50) -2028.33,-100 71.67,-100 ccw(c71.67,-50) 121.67,-50 71.67,150 ; -2027.97,149.86 cw(c-1961.67,133.33) -1978.2,199.64 ; -1978.33,200 21.67,200 ; 21.53,199.64 cw(c5,133.33) 71.3,149.86 ; 63.33,-129.17 ccw(c63.33,-50) 138.62,-25.54 ; 91.67,168.33 138.33,-25 ; -2353.33,-158.33 ccw(c-2311.67,-158.33) -2311.67,-200 346.67,-200 ccw(c346.67,-150) 396.67,-150 396.67,250 ccw(c346.67,250) 346.67,300 -2311.67,300 ccw(c-2311.67,258.33) -2353.33,258.33 -2353.33,-158.33
  text "1" at 61.67,-30 h50
  text "19" at -2078.33,-30 h50
  text "37" at -2038.33,50 h50
  text "20" at 1.67,70 h50

## DB37SSM [mil]
pads (37):
  oct 62.5x141.67 smd: 1(0,0)
  oval 62.5x141.67 smd: 2(-110,0) 3(-220,0) 4(-330,0) 5(-440,0) 6(-550,0) 7(-660,0) 8(-770,0) 9(-880,0) 10(-990,0) 11(-1100,0) 12(-1210,0) 13(-1320,0) 14(-1430,0) 15(-1540,0) 16(-1650,0) 17(-1760,0) 18(-1870,0) 19(-1980,0)
  oval 78.74x39.37 smd far side: 20(-55,0) 21(-165,0) 22(-275,0) 23(-385,0) 24(-495,0) 25(-605,0) 26(-715,0) 27(-825,0) 28(-935,0) 29(-1045,0) 30(-1155,0) 31(-1265,0) 32(-1375,0) 33(-1485,0) 34(-1595,0) 35(-1705,0) 36(-1815,0) 37(-1925,0)
Top Overlay:
  lines w8: -2356.67,351.67 -2298.33,351.67 ; -2298.33,335 -2356.67,335 -2356.67,368.33 376.67,368.33 376.67,335 310,335 ; -2298.33,368.33 -2298.33,318.33 -2198.33,318.33 -2198.33,368.33 ; -2198.33,335 218.33,335 ; -2198.33,351.67 218.33,351.67 ; -2181.67,335 cw(c-2181.67,285) -2131.67,285 -2131.67,226.67 ccw(c-2081.67,226.67) -2081.67,176.67 ; -2148.33,368.33 ccw(c-2148.33,401.67) -2115,401.67 -2115,568.33 cw(c-2081.67,568.33) -2081.67,601.67 101.67,601.67 cw(c101.67,568.33) 135,568.33 135,401.67 ccw(c168.33,401.67) 168.33,368.33 ; -1740,460 -1740,560 -1640,560 -1640,460 ; -1540,460 -1540,560 -1440,560 -1440,460 ; -1340,460 -1340,560 -1240,560 -1240,460 ; -1140,460 -1140,560 -1040,560 -1040,460 ; -940,460 -940,560 -840,560 -840,460 ; -740,460 -740,560 -640,560 -640,460 ; -540,460 -540,560 -440,560 -440,460 ; -340,460 -340,560 -240,560 -240,460 ; 201.67,335 ccw(c201.67,285) 151.67,285 151.67,226.67 cw(c101.67,226.67) 101.67,176.67 ; 218.33,368.33 218.33,318.33 310,318.33 310,368.33 ; 310,351.67 376.67,351.67 ; -2081.67,176.67 -2081.67,110 101.67,110 101.67,176.67 ; -2081.67,176.67 101.67,176.67
  text "1" at -10,130 h50
  text "19" at -2010,130 h50

## DB37SSW [mil]
pads (39):
  oct 62x62 hole 35: 1(0,0)
  round 62 hole 35: 2(-108.33,0) 3(-216.67,0) 4(-325,0) 5(-433.33,0) 6(-541.67,0) 7(-650,0) 8(-758.33,0) 9(-866.67,0) 10(-975,0) 11(-1083.33,0) 12(-1191.67,0) 13(-1300,0) 14(-1408.33,0) 15(-1516.67,0) 16(-1625,0) 17(-1733.33,0) 18(-1841.67,0) 19(-1950,0) 20(-54.17,113.33) 21(-162.5,113.33) 22(-270.83,113.33) 23(-379.17,113.33) 24(-487.5,113.33) 25(-595.83,113.33) 26(-704.17,113.33) 27(-812.5,113.33) 28(-920.83,113.33) 29(-1029.17,113.33) 30(-1137.5,113.33) 31(-1245.83,113.33) 32(-1354.17,113.33) 33(-1462.5,113.33) 34(-1570.83,113.33) 35(-1679.17,113.33) 36(-1787.5,113.33) 37(-1895.83,113.33)
  round 196.67 hole 118.33: BO1(-2228.33,56.67) BO2(271.67,56.67)
Top Overlay:
  lines w8: -2095,-43.33 -2045,165 ; -2094.5,-43.54 ccw(c-2028.33,-51.67) -2028.33,-118.33 80,-118.33 ; -2044.7,165.58 cw(c-1970,148.33) -1970,225 13.33,225 cw(c13.33,148.33) 86.25,172.02 ; -2028.59,156.57 cw(c-1970,148.33) -1978.23,206.92 ; -2028.33,156.67 -2078.33,-43.33 ccw(c-2028.33,-43.33) -2028.33,-93.33 71.67,-93.33 ccw(c71.67,-43.33) 121.67,-43.33 71.67,156.67 ; -1978.33,206.67 21.67,206.67 ; 21.57,206.92 cw(c13.33,148.33) 71.92,156.57 ; 79.89,-118.66 ccw(c71.67,-51.67) 137.16,-35.34 ; 85,171.67 138.33,-35 ; 387.57,-143.72 cw(c346.67,-151.67) 346.67,-193.33 -2303.33,-193.33 cw(c-2303.33,-151.67) -2345,-151.67 -2345,265 cw(c-2303.33,265) -2303.33,306.67 346.67,306.67 cw(c346.67,265) 388.33,265 388.33,-151.67
  text "20" at 1.67,96.67 h50
  text "1" at 61.67,-23.33 h50
  text "37" at -2038.33,76.67 h50
  text "19" at -2078.33,-43.33 h50

## DB50FL [mil]
pads (52):
  oct 62x62 hole 35: 1(0,0)
  round 62 hole 35: 2(108.33,0) 3(216.67,0) 4(325,0) 5(430,0) 6(541.67,0) 7(650,0) 8(758.33,0) 9(866.67,0) 10(975,0) 11(1083.33,0) 12(1191.67,0) 13(1296.67,0) 14(1408.33,0) 15(1516.67,0) 16(1625,0) 17(1733.33,0) 18(50,100) 19(158.33,100) 20(266.67,100) 21(375,100) 22(483.33,100) 23(591.67,100) 24(700,100) 25(808.33,100) 26(916.67,100) 27(1025,100) 28(1133.33,100) 29(1241.67,100) 30(1350,100) 31(1458.33,100) 32(1566.67,100) 33(1675,100) 34(0,200) 35(108.33,200) 36(216.67,200) 37(325,200) 38(433.33,200) 39(541.67,200) 40(650,200) 41(758.33,200) 42(866.67,200) 43(975,200) 44(1083.33,200) 45(1191.67,200) 46(1300,200) 47(1408.33,200) 48(1516.67,200) 49(1625,200) 50(1733.33,200)
  round 196.67 hole 118.33: BO1(-333.33,100) BO2(2066.67,100)
Top Overlay:
  lines w8: -458.33,300 -233.33,300 -233.33,550 ; -458.33,550 2191.67,550 ; -433.13,633.22 ccw(c-383.33,675) -333.54,633.22 ; -433.08,783.55 cw(c-383.33,750) -333.59,783.55 ; -408.33,608.33 -433.33,633.33 -433.33,783.33 -408.33,808.33 -258.33,808.33 -233.33,783.33 -233.33,633.33 -258.33,608.33 ; -383.33,200 -383.33,300 ; -358.33,300 -358.33,275 ccw(c-333.33,275) -308.33,275 -308.33,300 ; -333.33,633.33 -333.33,783.33 ; -333.13,633.22 ccw(c-283.33,675) -233.54,633.22 ; -333.08,783.55 cw(c-283.33,750) -233.59,783.55 ; -283.33,200 -283.33,300 ; -200,541.67 -200,450 ccw(c-150,450) -150,400 1883.33,400 ccw(c1883.33,450) 1933.33,450 1933.33,541.67 ; -133.33,608.33 -133.33,808.33 cw(c-83.33,808.33) -83.33,858.33 1816.67,858.33 cw(c1816.67,808.33) 1866.67,808.33 1866.67,608.33 ; 0,250 0,400 ; 50,150 50,400 ; 108.33,250 108.33,400 ; 158.33,150 158.33,400 ; 216.67,250 216.67,400 ; 266.67,150 266.67,400 ; 325,250 325,400 ; 375,150 375,400 ; 433.33,250 433.33,400 ; 483.33,150 483.33,400 ; 541.67,250 541.67,400 ; 591.67,150 591.67,400 ; 650,250 650,400 ; 700,150 700,400 ; 758.33,250 758.33,400 ; 808.33,150 808.33,400 ; 866.67,250 866.67,400 ; 916.67,166.67 916.67,150 916.67,400 ; 975,250 975,400 ; 1025,150 1025,400 ; 1083.33,250 1083.33,400 ; 1133.33,150 1133.33,400 ; 1191.67,250 1191.67,400 ; 1241.67,150 1241.67,400 ; 1300,250 1300,400 ; 1350,150 1350,400 ; 1408.33,250 1408.33,400 ; 1458.33,150 1458.33,400 ; 1516.67,250 1516.67,400 ; 1566.67,150 1566.67,400 ; 1625,250 1625,400 ; 1675,150 1675,400 ; 1733.33,250 1733.33,400 ; 1966.67,550 1966.67,300 2191.67,300 ; 1966.87,633.22 ccw(c2016.67,675) 2066.46,633.22 ; 1966.92,783.55 cw(c2016.67,750) 2066.41,783.55 ; 1991.67,608.33 1966.67,633.33 1966.67,783.33 1991.67,808.33 2141.67,808.33 2166.67,783.33 2166.67,633.33 2141.67,608.33 ; 2016.67,200 2016.67,300 ; 2041.67,300 2041.67,275 ccw(c2066.67,275) 2091.67,275 2091.67,300 ; 2066.67,633.33 2066.67,783.33 ; 2066.87,633.22 ccw(c2116.67,675) 2166.46,633.22 ; 2066.92,783.55 cw(c2116.67,750) 2166.41,783.55 ; 2116.67,200 2116.67,300 ; -458.33,-50 -458.33,608.33 2191.67,608.33 2191.67,-50 -458.33,-50
  text "18" at -93.33,80 h50
  text "1" at -93.33,-20 h50
  text "17" at 1806.67,-20 h50
  text "33" at 1746.67,80 h50
  text "50" at 1806.67,180 h50
  text "34" at -133.33,180 h50